# Altium footprint library Nanjar's Library.PcbLib: 153 footprints (part 5 of 10)
Each footprint in its own frame and in the unit in brackets; x right, y up, seen from the top. Pads: shape width x height; smd on the part's side, far side on the other; paste and mask are expansions set on the pad; w line width, h text height; cw(c..) or ccw(c..) is an arc to the next point about the centre after c.
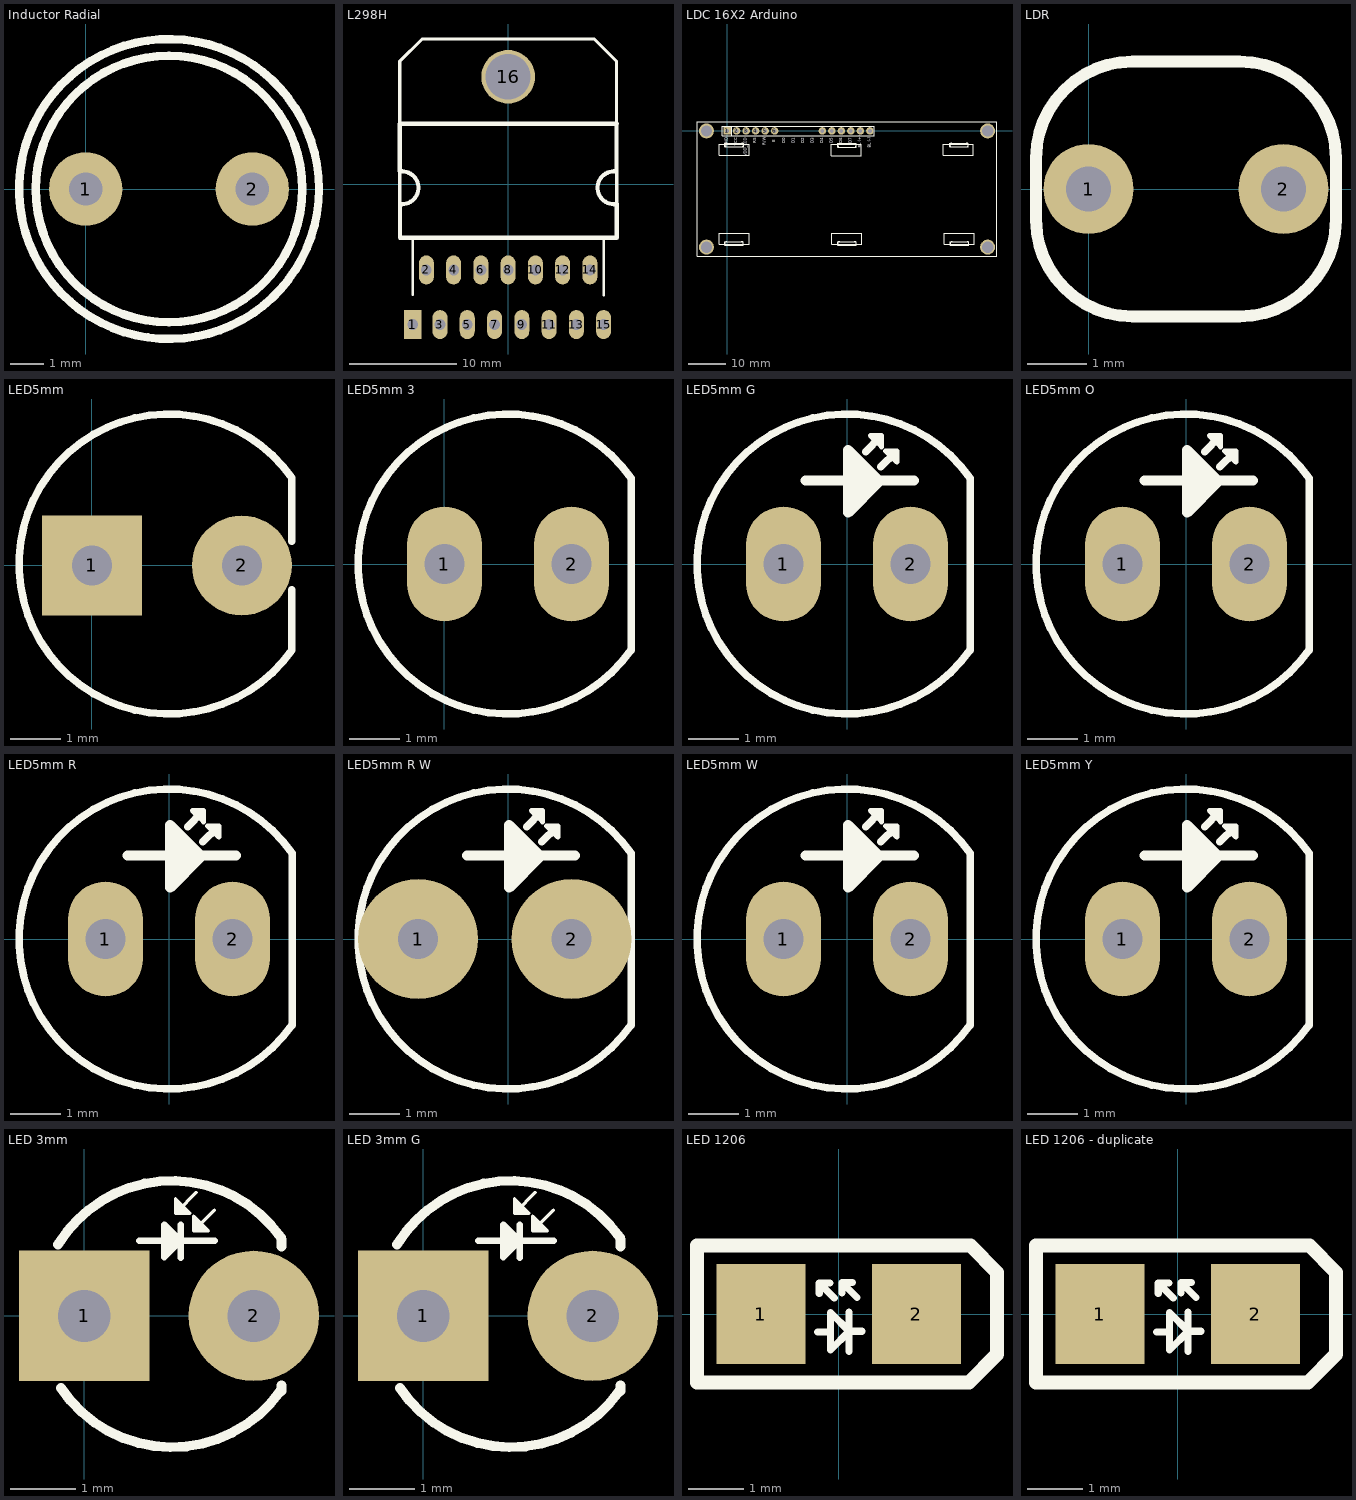
[diagram p4: the footprints below, top view; thin cyan lines are the x and y axes]

## Inductor Radial [mm] "RLB9012"
pads (2):
  round 2.2 hole 1: 1(0,0) 2(5,0)
Top Overlay:
  circle w0.254: c2.5,0 r4
  circle w0.254: c2.5,0 r4.5
3D body "SW3dPS-CT187LY-271.STEP": height 11.2, standoff -5, extent -1.64,-4.15 6.66,4.15

## L298H [mm]
pads (16):
  rect 1.6x2.7 hole 1: 1(-8.913,-13.068)
  oval 1.4x2.7 hole 1: 2(-7.643,-7.988) 3(-6.373,-13.068) 4(-5.103,-7.988) 5(-3.833,-13.068) 6(-2.563,-7.988) 7(-1.293,-13.068) 8(-0.023,-7.988) 9(1.247,-13.068) 10(2.517,-7.988) 11(3.787,-13.068) 12(5.057,-7.988) 13(6.327,-13.068) 14(7.597,-7.988) 15(8.867,-13.068)
  round 5 hole 4.2: 16(-0.023,10.012)
Top Overlay:
  lines w0.254: -8.913,-10.275 -8.913,-5.05 ; 8.837,-4.975 8.887,-5.025 8.887,-10.325
  lines w0.3: -10.113,-5 -10.113,5.625 -10.113,11.45 -8.038,13.525 8.012,13.525 10.062,11.475 10.062,5.625 ; 10.087,-5 10.087,5.625
  lines w0.39: -9.913,-1.865 ccw(c-9.913,-0.332) -9.913,1.2 ; 9.837,-1.865 cw(c9.837,-0.332) 9.837,1.2
  lines w0.4: -10.113,1.2 -10.113,5.625 10.087,5.625 ; -10.088,-1.825 -10.088,-5 10.087,-5 10.087,-1.825 ; 10.062,1.2 10.062,5.625

## LDC 16X2 Arduino [mm]
pads (16):
  rect 2x2 hole 1: 1(0,0)
  round 2 hole 1: 2(2.54,0) 3(5.08,0) 4(7.62,0) 5(10.16,0) 6(12.7,0) 11(25.4,0) 12(27.94,0) 13(30.48,0) 14(33.02,0) 15(35.56,0) 16(38.1,0)
  round 4 hole 3: ""(-5.5,-31) ""(-5.5,0) ""(69.52,-31) ""(69.52,0)
Top Overlay:
  lines w0.254: -8.025,-27.75 -8.025,-33.5 -0.775,-33.5 ; -8.025,-3.25 -8.025,2.5 -0.775,2.5 ; -0.125,-30.518 cw(c-0.125,-30.025) -0.099,-29.533 ; -0.075,-4.243 cw(c-0.075,-3.75) -0.049,-3.258 ; 1.22,-1.27 1.22,1.27 ; 3.824,-29.533 cw(c3.85,-30.025) 3.85,-30.518 ; 3.874,-3.258 cw(c3.9,-3.75) 3.9,-4.243 ; 30,-29.507 ccw(c30,-30) 30.026,-30.492 ; 30,-3.357 ccw(c30,-3.85) 30.026,-4.342 ; 33.949,-30.492 ccw(c33.975,-30) 33.975,-29.507 ; 33.949,-4.342 ccw(c33.975,-3.85) 33.975,-3.357 ; 59.9,-4.243 cw(c59.9,-3.75) 59.926,-3.258 ; 60.05,-29.507 ccw(c60.05,-30) 60.076,-30.492 ; 63.849,-3.258 cw(c63.875,-3.75) 63.875,-4.243 ; 63.999,-30.492 ccw(c64.025,-30) 64.025,-29.507 ; 64.725,-33.5 71.975,-33.5 71.975,-27.75 ; 64.725,2.5 71.975,2.5 71.975,-3.25 ; -2.025,-30.25 -2.025,-27.25 5.975,-27.25 5.975,-30.25 -2.025,-30.25 ; -2.025,-6.5 -2.025,-3.5 5.975,-3.5 5.975,-6.5 -2.025,-6.5 ; -1.32,-1.27 -1.32,1.27 39.32,1.27 39.32,-1.27 -1.32,-1.27 ; -0.625,-30.525 -0.625,-29.525 4.375,-29.525 4.375,-30.525 -0.625,-30.525 ; -0.575,-4.25 -0.575,-3.25 4.425,-3.25 4.425,-4.25 -0.575,-4.25 ; 27.775,-6.6 27.775,-3.6 35.775,-3.6 35.775,-6.6 27.775,-6.6 ; 27.975,-30.25 27.975,-27.25 35.975,-27.25 35.975,-30.25 27.975,-30.25 ; 29.475,-30.5 34.475,-30.5 34.475,-29.5 29.475,-29.5 29.475,-30.5 ; 29.475,-4.35 29.475,-3.35 34.475,-3.35 34.475,-4.35 29.475,-4.35 ; 57.725,-6.5 65.725,-6.5 65.725,-3.5 57.725,-3.5 57.725,-6.5 ; 57.975,-30.25 65.975,-30.25 65.975,-27.25 57.975,-27.25 57.975,-30.25 ; 59.375,-4.25 64.375,-4.25 64.375,-3.25 59.375,-3.25 59.375,-4.25 ; 59.525,-30.5 59.525,-29.5 64.525,-29.5 64.525,-30.5 59.525,-30.5
  lines w0.3: -8,-33.5 -8,2.515 72.009,2.515 72.009,-33.5 -8,-33.5
  text "D2" at 20.82,-3.26 h1.26
  text "D3" at 23.36,-3.26 h1.26
  text "D6" at 30.98,-3.26 h1.26
  text "D5" at 28.44,-3.26 h1.26
  text "BL (+)" at 36.06,-4.53 h1.26
  text "D4" at 25.9,-3.26 h1.26
  text "BL (-)" at 38.6,-4.53 h1.26
  text "GND" at 0.425,-4.025 h1.26
  text "VCC" at 2.95,-3.975 h1.26
  text "VDD_LCD" at 5.475,-6.8 h1.26
  text "RS" at 8.025,-3.25 h1.26
  text "D1" at 18.28,-3.26 h1.26
  text "D0" at 15.74,-3.26 h1.26
  text "R/W" at 10.56,-3.81 h1.26
  text "D7" at 33.52,-3.26 h1.26
  text "E" at 13.132,-2.972 h1.26
3D body "arduino-LCD-5.step": height 20.3, standoff 2, extent -8.005,-33.5 71.995,2.5
3D body: height 8, standoff 0.1, extent -1.295,-0.762 -0.787,0.762
3D body: height 1, standoff -3, extent 12.325,-0.35 13.025,0.35
3D body: height 1, standoff -3, extent 4.705,-0.35 5.405,0.35
3D body: height 8, standoff 0.1, extent 5.817,-0.762 6.833,0.762
3D body: height 1, standoff -3, extent 7.245,-0.35 7.945,0.35
3D body: height 8, standoff 0.1, extent 8.357,-0.762 9.373,0.762
3D body: height 1, standoff -3, extent 9.785,-0.35 10.485,0.35
3D body: height 1, standoff -3, extent 12.325,-0.35 13.025,0.35
3D body: height 8, standoff 0.1, extent 10.897,-0.762 11.913,0.762
3D body: height 8, standoff 0.1, extent 13.437,-0.762 13.945,0.762
3D body: height 8, standoff 0.1, extent 3.277,-0.762 4.293,0.762
3D body: height 1, standoff -3, extent 2.165,-0.35 2.865,0.35
3D body: height 8, standoff 0.1, extent 0.737,-0.762 1.753,0.762
3D body: height 1, standoff -3, extent -0.375,-0.35 0.325,0.35
3D body: height 8, standoff 0.1, extent -1.295,-1.27 13.945,-0.762
3D body: height 8, standoff 0.1, extent -1.295,0.762 13.945,1.27
3D body: height 8, standoff 0.1, extent 24.105,-0.762 24.613,0.762
3D body: height 1, standoff -3, extent 37.725,-0.35 38.425,0.35
3D body: height 1, standoff -3, extent 30.105,-0.35 30.805,0.35
3D body: height 8, standoff 0.1, extent 31.217,-0.762 32.233,0.762
3D body: height 1, standoff -3, extent 32.645,-0.35 33.345,0.35
3D body: height 8, standoff 0.1, extent 33.757,-0.762 34.773,0.762
3D body: height 1, standoff -3, extent 35.185,-0.35 35.885,0.35
3D body: height 1, standoff -3, extent 37.725,-0.35 38.425,0.35
3D body: height 8, standoff 0.1, extent 36.297,-0.762 37.313,0.762
3D body: height 8, standoff 0.1, extent 38.837,-0.762 39.345,0.762
3D body: height 8, standoff 0.1, extent 28.677,-0.762 29.693,0.762
3D body: height 1, standoff -3, extent 27.565,-0.35 28.265,0.35
3D body: height 8, standoff 0.1, extent 26.137,-0.762 27.153,0.762
3D body: height 1, standoff -3, extent 25.025,-0.35 25.725,0.35
3D body: height 8, standoff 0.1, extent 24.105,-1.27 39.345,-0.762
3D body: height 8, standoff 0.1, extent 24.105,0.762 39.345,1.27

## LDR [mil]
pads (2):
  round 60 hole 30: 1(0,0) 2(130,0)
Top Overlay:
  lines w7.99: 29.49,-85 cw(c29.49,-20.51) -35,-20.51 -35,20.51 cw(c29.49,20.51) 29.49,85 ; 100.51,-85 ccw(c100.51,-20.51) 165,-20.51 165,15.51 ; 100.51,85 cw(c100.51,20.51) 165,20.51
  lines w8: 29.49,-85 100.51,-85 ; 29.49,85 100.51,85 ; 165,15.51 165,20.51
3D body "User Library-KE-10715.step": height 252.36, standoff -62.99, extent -35.79,-85 165,84.29

## LED5mm [mm]
pads (2):
  rect 2x2 hole 0.8: 1(0,0)
  round 2 hole 0.8: 2(3,0)
Top Overlay:
  lines w0.15: 4.001,-1.692 4.001,-0.487 ; 4,-1.691 cw(c1.542,0.03) 4,1.75 ; 4.001,0.487 4.001,1.749
3D body "User Library-LED5ON-Red.step": height 8.5, standoff -5, extent -1.5,-3 4,3

## LED5mm 3 [mm]
pads (2):
  oval 1.5x2.3 hole 0.8: 1(0,0) 2(2.54,0)
Top Overlay:
  lines w0.15: 3.728,-1.72 cw(c1.27,0) 3.728,1.72 ; 3.73,-1.72 3.73,0.45 ; 3.73,0.453 3.73,1.715
3D body "User Library-LED5ON-Red.step": height 8.5, standoff -5, extent -1.73,-3 3.77,3

## LED5mm G [mm]
pads (2):
  oval 1.5x2.3 hole 0.8: 1(-1.27,0) 2(1.27,0)
Top Overlay:
  lines w0.1: 0.128,1.765 0.128,1.986 0.352,1.762 ; 0.155,1.316 0.379,1.54 0.158,1.54 ; 0.694,2.564 0.694,2.343 0.47,2.567 0.694,2.567 ; 0.998,2.257 0.998,2.036 0.774,2.26 0.998,2.26
  lines w0.15: 0.374,2.249 0.668,2.543 ; 0.678,1.942 0.972,2.236 ; 2.458,-1.72 cw(c0,0) 2.458,1.72 ; 2.46,-1.72 2.46,0.45 ; 2.46,0.453 2.46,1.715
  lines w0.2: -0.825,1.666 1.34,1.666 ; 0.024,1.025 0.637,1.638 ; 0.024,1.026 0.024,2.279 0.637,1.666
  lines w0.3: 0.128,1.762 0.352,1.762 ; 0.155,1.316 0.155,1.54
3D body "User Library-LED5ON-Green.step": height 8.5, standoff -2, extent -3,-2.998 2.5,2.998

## LED5mm O [mm]
pads (2):
  oval 1.5x2.3 hole 0.8: 1(-1.27,0) 2(1.27,0)
Top Overlay:
  lines w0.1: 0.128,1.765 0.128,1.986 0.352,1.762 ; 0.155,1.316 0.379,1.54 0.158,1.54 ; 0.694,2.564 0.694,2.343 0.47,2.567 0.694,2.567 ; 0.998,2.257 0.998,2.036 0.774,2.26 0.998,2.26
  lines w0.15: 0.374,2.249 0.668,2.543 ; 0.678,1.942 0.972,2.236 ; 2.458,-1.72 cw(c0,0) 2.458,1.72 ; 2.46,-1.72 2.46,0.45 ; 2.46,0.453 2.46,1.715
  lines w0.2: -0.825,1.666 1.34,1.666 ; 0.024,1.025 0.637,1.638 ; 0.024,1.026 0.024,2.279 0.637,1.666
  lines w0.3: 0.128,1.762 0.352,1.762 ; 0.155,1.316 0.155,1.54
3D body "LEDd5O.STEP": height 8.81, standoff -5.99, extent -2.98,-3.01 2.44,3.01

## LED5mm R [mm]
pads (2):
  oval 1.5x2.3 hole 0.8: 1(-1.27,0) 2(1.27,0)
Top Overlay:
  lines w0.1: 0.128,1.765 0.128,1.986 0.352,1.762 ; 0.155,1.316 0.379,1.54 0.158,1.54 ; 0.694,2.564 0.694,2.343 0.47,2.567 0.694,2.567 ; 0.998,2.257 0.998,2.036 0.774,2.26 0.998,2.26
  lines w0.15: 0.374,2.249 0.668,2.543 ; 0.678,1.942 0.972,2.236 ; 2.458,-1.72 cw(c0,0) 2.458,1.72 ; 2.46,-1.72 2.46,0.45 ; 2.46,0.453 2.46,1.715
  lines w0.2: -0.825,1.666 1.34,1.666 ; 0.024,1.025 0.637,1.638 ; 0.024,1.026 0.024,2.279 0.637,1.666
  lines w0.3: 0.128,1.762 0.352,1.762 ; 0.155,1.316 0.155,1.54
3D body "User Library-LED5ON-Red.step": height 8.5, standoff -2, extent -3,-2.998 2.5,2.998

## LED5mm R W [mm]
pads (2):
  round 2.4 hole 0.8: 1(-1.8,0) 2(1.27,0)
Top Overlay:
  lines w0.1: 0.128,1.765 0.128,1.986 0.352,1.762 ; 0.155,1.316 0.379,1.54 0.158,1.54 ; 0.694,2.564 0.694,2.343 0.47,2.567 0.694,2.567 ; 0.998,2.257 0.998,2.036 0.774,2.26 0.998,2.26
  lines w0.15: 0.374,2.249 0.668,2.543 ; 0.678,1.942 0.972,2.236 ; 2.458,-1.72 cw(c0,0) 2.458,1.72 ; 2.46,-1.72 2.46,0.45 ; 2.46,0.453 2.46,1.715
  lines w0.2: -0.825,1.666 1.34,1.666 ; 0.024,1.025 0.637,1.638 ; 0.024,1.026 0.024,2.279 0.637,1.666
  lines w0.3: 0.128,1.762 0.352,1.762 ; 0.155,1.316 0.155,1.54
3D body "User Library-LED5ON-Red.step": height 8.5, standoff -2, extent -3,-2.998 2.5,2.998

## LED5mm W [mm]
pads (2):
  oval 1.5x2.3 hole 0.8: 1(-1.27,0) 2(1.27,0)
Top Overlay:
  lines w0.1: 0.128,1.765 0.128,1.986 0.352,1.762 ; 0.155,1.316 0.379,1.54 0.158,1.54 ; 0.694,2.564 0.694,2.343 0.47,2.567 0.694,2.567 ; 0.998,2.257 0.998,2.036 0.774,2.26 0.998,2.26
  lines w0.15: 0.374,2.249 0.668,2.543 ; 0.678,1.942 0.972,2.236 ; 2.458,-1.72 cw(c0,0) 2.458,1.72 ; 2.46,-1.72 2.46,0.45 ; 2.46,0.453 2.46,1.715
  lines w0.2: -0.825,1.666 1.34,1.666 ; 0.024,1.025 0.637,1.638 ; 0.024,1.026 0.024,2.279 0.637,1.666
  lines w0.3: 0.128,1.762 0.352,1.762 ; 0.155,1.316 0.155,1.54
3D body "User Library-LED5ON SB.step": height 8.5, standoff -2, extent -3,-3 2.5,3

## LED5mm Y [mm]
pads (2):
  oval 1.5x2.3 hole 0.8: 1(-1.27,0) 2(1.27,0)
Top Overlay:
  lines w0.1: 0.128,1.765 0.128,1.986 0.352,1.762 ; 0.155,1.316 0.379,1.54 0.158,1.54 ; 0.694,2.564 0.694,2.343 0.47,2.567 0.694,2.567 ; 0.998,2.257 0.998,2.036 0.774,2.26 0.998,2.26
  lines w0.15: 0.374,2.249 0.668,2.543 ; 0.678,1.942 0.972,2.236 ; 2.458,-1.72 cw(c0,0) 2.458,1.72 ; 2.46,-1.72 2.46,0.45 ; 2.46,0.453 2.46,1.715
  lines w0.2: -0.825,1.666 1.34,1.666 ; 0.024,1.025 0.637,1.638 ; 0.024,1.026 0.024,2.279 0.637,1.666
  lines w0.3: 0.128,1.762 0.352,1.762 ; 0.155,1.316 0.155,1.54
3D body "User Library-LED5ON-Yellow.step": height 8.5, standoff -2, extent -3,-2.998 2.5,2.998

## LED 3mm [mm]
pads (2):
  rect 2x2 hole 0.8: 1(0,0)
  round 2 hole 0.8: 2(2.6,0)
Top Overlay:
  lines w0.05: 1.398,1.575 1.622,1.575 1.398,1.799 1.398,1.578 ; 1.424,1.599 1.718,1.893 ; 1.677,1.307 1.677,1.528 1.901,1.304 1.679,1.304 1.997,1.622
  lines w0.1: 0.844,1.151 2,1.151 ; 1.25,1.05 1.325,1.125 ; 1.25,1.25 1.325,1.175 ; 1.45,1.7 1.45,1.625 1.525,1.625 ; 1.478,0.894 1.478,1.147 ; 1.478,1.4 1.478,1.147 ; 1.725,1.425 1.725,1.35 1.8,1.35 ; 1.225,1.4 1.225,0.9 1.472,1.147 1.478,1.147 ; 1.225,1.4 1.478,1.147 ; 1.225,1.4 1.225,1.4
  lines w0.15: -0.401,1.094 cw(c1.342,0.03) 3.015,1.201 ; -0.357,-1.103 ccw(c1.342,0.03) 3.015,-1.142 ; 3.025,-1.15 3.025,-1.063 ; 3.025,1.064 3.025,1.175
3D body "SW3dPS-LEDd3G.STEP": height 29.01, standoff 21.01, extent -0.369,-1.654 2.931,1.646

## LED 3mm G [mm]
pads (2):
  rect 2x2 hole 0.8: 1(0,0)
  round 2 hole 0.8: 2(2.6,0)
Top Overlay:
  lines w0.05: 1.398,1.575 1.622,1.575 1.398,1.799 1.398,1.578 ; 1.424,1.599 1.718,1.893 ; 1.677,1.307 1.677,1.528 1.901,1.304 1.679,1.304 1.997,1.622
  lines w0.1: 0.844,1.151 2,1.151 ; 1.25,1.05 1.325,1.125 ; 1.25,1.25 1.325,1.175 ; 1.45,1.7 1.45,1.625 1.525,1.625 ; 1.478,0.894 1.478,1.147 ; 1.478,1.4 1.478,1.147 ; 1.725,1.425 1.725,1.35 1.8,1.35 ; 1.225,1.4 1.225,0.9 1.472,1.147 1.478,1.147 ; 1.225,1.4 1.478,1.147 ; 1.225,1.4 1.225,1.4
  lines w0.15: -0.401,1.094 cw(c1.342,0.03) 3.015,1.201 ; -0.357,-1.103 ccw(c1.342,0.03) 3.015,-1.142 ; 3.025,-1.15 3.025,-1.063 ; 3.025,1.064 3.025,1.175
3D body "SW3dPS-LEDd3G.STEP": height 4.71, standoff -3.29, extent -0.369,-1.654 2.931,1.646

## LED 1206 [mm]
height 5.72
pads (2):
  rect 1.6x1.8 smd: 1(-1.4,0) 2(1.4,0)
Top Overlay:
  lines w0.127: -0.38,-0.32 -0.15,-0.32 ; -0.35,0.37 -0.35,0.56 ; -0.16,0.56 -0.35,0.56 ; -0.08,0.29 -0.35,0.56 ; 0.06,0.38 0.06,0.57 ; 0.19,-0.67 0.19,-0.31 ; 0.25,0.57 0.06,0.57 ; 0.33,0.3 0.06,0.57 ; 0.42,-0.31 0.19,-0.31 ; -0.15,-0.32 -0.15,0.03 0.19,-0.31 ; -0.15,-0.32 -0.15,-0.65 0.19,-0.31 ; 0.19,-0.31 0.19,0.04 0.19,-0.31
  lines w0.254: -2.55,-1.23 -2.55,1.23 2.37,1.23 2.85,0.75 2.85,0.305 2.85,-0.725 2.345,-1.23 -2.55,-1.23
3D body: height 0.5, standoff 0.2, extent -1.143,-0.889 1.143,0.889
3D body: height 0.2, standoff 0, extent -1.651,-0.889 1.651,0.889
3D body: height 0.4, standoff 0.2, extent -0.509,-0.762 1.143,0.254
3D body: height 0.4, standoff 0.2, extent -1.143,-0.127 0.635,0.762

## LED 1206 - duplicate [mm]
height 5.72
pads (2):
  rect 1.6x1.8 smd: 1(-1.4,0) 2(1.4,0)
Top Overlay:
  lines w0.127: -0.38,-0.32 -0.15,-0.32 ; -0.35,0.37 -0.35,0.56 ; -0.16,0.56 -0.35,0.56 ; -0.08,0.29 -0.35,0.56 ; 0.06,0.38 0.06,0.57 ; 0.19,-0.67 0.19,-0.31 ; 0.25,0.57 0.06,0.57 ; 0.33,0.3 0.06,0.57 ; 0.42,-0.31 0.19,-0.31 ; -0.15,-0.32 -0.15,-0.65 0.19,-0.31 ; -0.15,-0.32 -0.15,0.03 0.19,-0.31 ; 0.19,-0.31 0.19,0.04 0.19,-0.31
  lines w0.254: -2.55,-1.23 2.345,-1.23 2.85,-0.725 2.85,0.305 2.85,0.75 2.37,1.23 -2.55,1.23 -2.55,-1.23
3D body "Surface Mount Chip LED 3.2x1.6mm 2.stp": height 1.11, standoff 0, extent -1.6,-0.803 1.6,0.797